# Altium footprint library TranDangKhoa-LIB.PcbLib: 1435 footprints (part 44 of 90)
Each footprint in its own frame and in the unit in brackets; x right, y up, seen from the top. Pads: shape width x height; smd on the part's side, far side on the other; paste and mask are expansions set on the pad; w line width, h text height; cw(c..) or ccw(c..) is an arc to the next point about the centre after c.
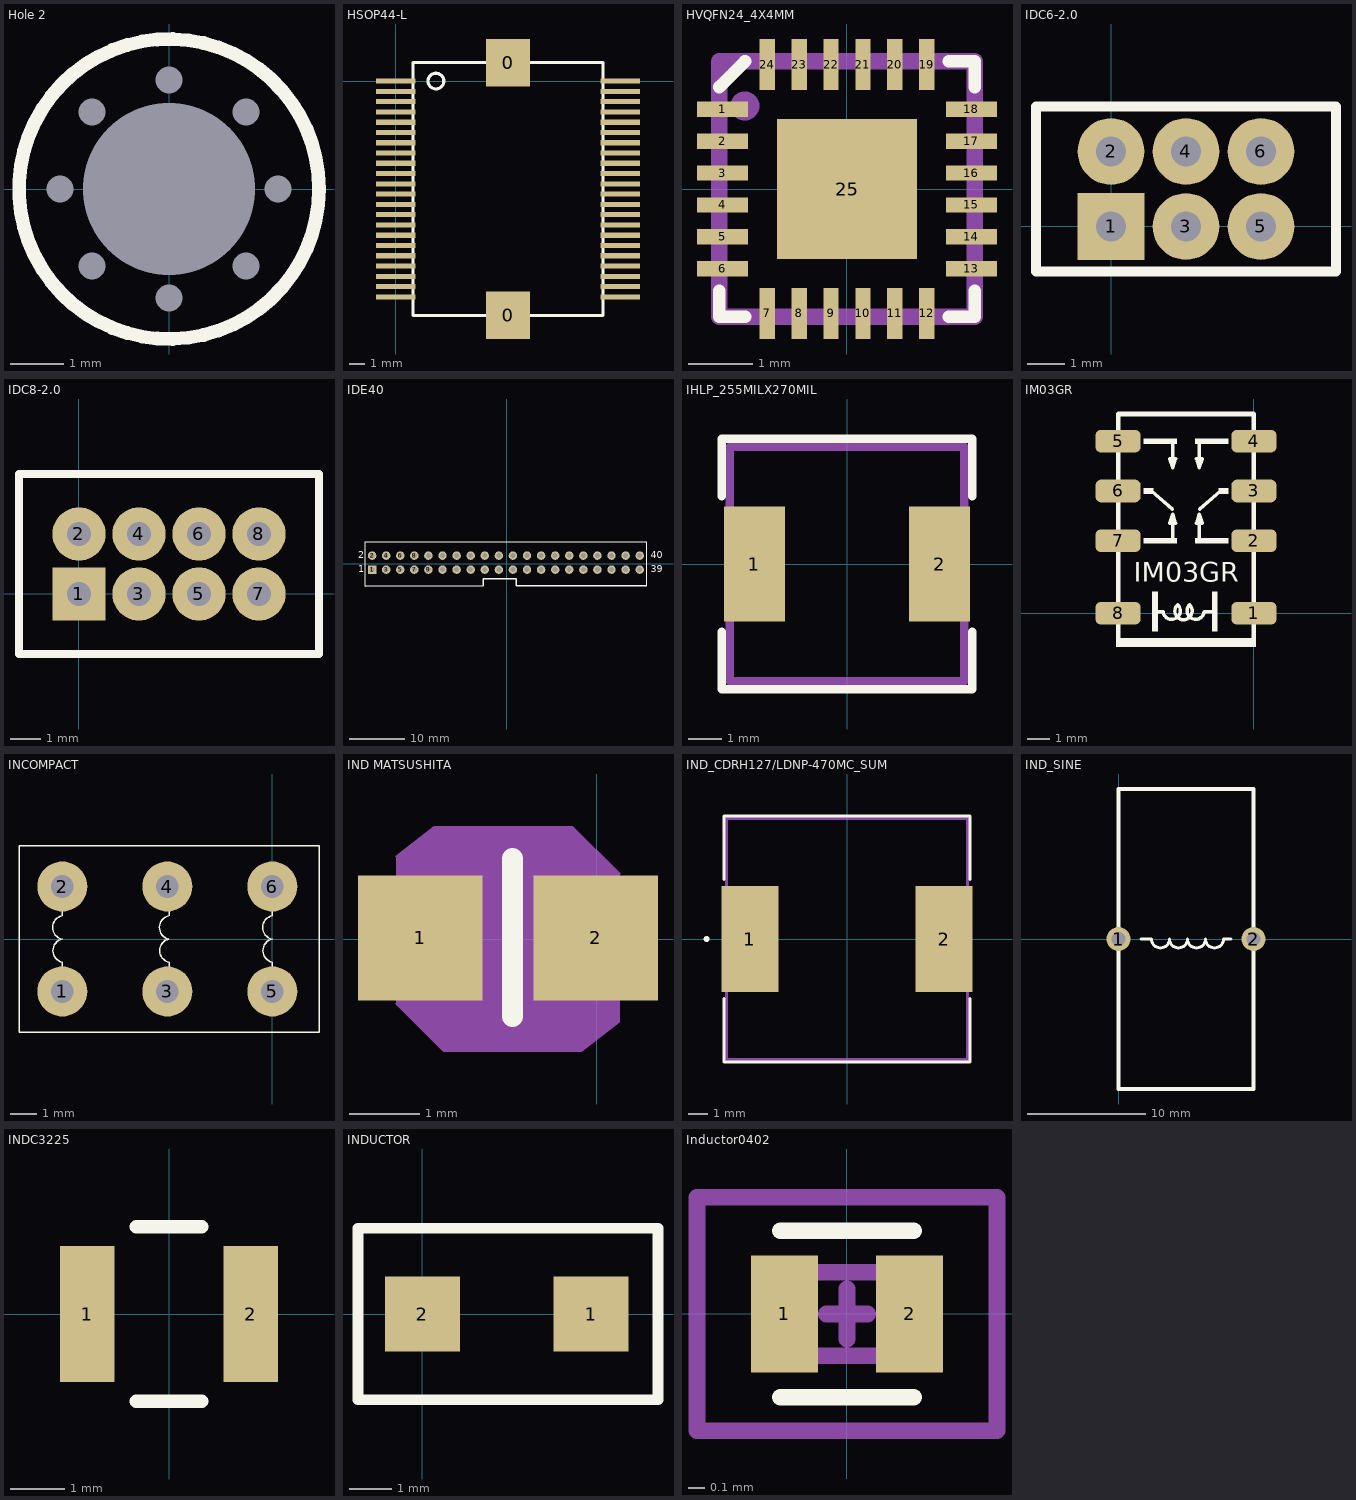
[diagram p43: the footprints below, top view; thin cyan lines are the x and y axes]

## Hole 2 [mm] "Hole 5mm-3.2mm"
pads (9):
  round 0 hole 0.5 unplated: 1(-2.032,0) 1(-1.437,-1.437) 1(-1.437,1.437) 1(0,-2.032) 1(0,2.032) 1(1.437,-1.437) 1(1.437,1.437) 1(2.032,0)
  round 0 hole 3.2 unplated: 1(0,0)
Top Overlay:
  circle w0.254: c0,0 r2.794

## HSOP44-L [mm]
pads (46):
  rect 2.8x3 smd: 0(7.1,-14.815) 0(7.1,1.162)
  rect 2.5x0.325 smd: 1(0,0) 2(0,-0.65) 3(0,-1.3) 4(0,-1.95) 5(0,-2.6) 6(0,-3.25) 7(0,-3.9) 8(0,-4.55) 9(0,-5.2) 10(0,-5.85) 11(0,-6.5) 12(0,-7.15) 13(0,-7.8) 14(0,-8.45) 15(0,-9.1) 16(0,-9.75) 17(0,-10.4) 18(0,-11.05) 19(0,-11.7) 20(0,-12.35) 21(0,-13) 22(0,-13.65) 23(14.2,-13.65) 24(14.2,-13) 25(14.2,-12.35) 26(14.2,-11.7) 27(14.2,-11.05) 28(14.2,-10.4) 29(14.2,-9.75) 30(14.2,-9.1) 31(14.2,-8.45) 32(14.2,-7.8) 33(14.2,-7.15) 34(14.2,-6.5) 35(14.2,-5.85) 36(14.2,-5.2) 37(14.2,-4.55) 38(14.2,-3.9) 39(14.2,-3.25) 40(14.2,-2.6) 41(14.2,-1.95) 42(14.2,-1.3) 43(14.2,-0.65) 44(14.2,0)
Top Overlay:
  circle w0.2: c2.54,0 r0.5
  lines w0.2: 1.1,-14.825 1.1,1.175 13.1,1.175 13.1,-14.825 1.1,-14.825

## HVQFN24_4X4MM [mm]
pads (25):
  rect 0.8x0.24 smd mask+0.025: 1(-1.95,1.25) 2(-1.95,0.75) 3(-1.95,0.25) 4(-1.95,-0.25) 5(-1.95,-0.75) 6(-1.95,-1.25) 13(1.95,-1.25) 14(1.95,-0.75) 15(1.95,-0.25) 16(1.95,0.25) 17(1.95,0.75) 18(1.95,1.25)
  rect 0.24x0.8 smd mask+0.025: 7(-1.25,-1.95) 8(-0.75,-1.95) 9(-0.25,-1.95) 10(0.25,-1.95) 11(0.75,-1.95) 12(1.25,-1.95) 19(1.25,1.95) 20(0.75,1.95) 21(0.25,1.95) 22(-0.25,1.95) 23(-0.75,1.95) 24(-1.25,1.95)
  rect 2.2x2.2 smd mask+0.025: 25(0,0)
Top Overlay:
  lines w0.2: -2,-1.6 -2,-2 -1.6,-2 ; -2,1.6 -1.6,2 ; 1.6,-2 2,-2 2,-1.6 ; 1.6,2 2,2 2,1.6
Mechanical 16:
  circle w0.254: c-1.6,1.3 r0.1
  lines w0.254: -2,-2 2,-2 2,2 -2,2 -2,-2
Mechanical 29:
  text ".Designator" at -0.2,0.7 h0.6
3D body: height 1, standoff 0, extent -2,-2 2,2

## IDC6-2.0 [mil]
pads (6):
  rect 70x70 hole 32 unplated: 1(0,0)
  round 70 hole 32 unplated: 2(0,78.74) 3(78.74,0) 4(78.74,78.74) 5(157.48,0) 6(157.48,78.74)
Top Overlay:
  lines w10: -78.74,-47.24 -78.74,125.98 236.22,125.98 236.22,-47.24 -78.74,-47.24

## IDC8-2.0 [mil]
pads (8):
  rect 70x70 hole 32 unplated: 1(0,0)
  round 70 hole 32 unplated: 2(0,78.74) 3(78.74,0) 4(78.74,78.74) 5(157.48,0) 6(157.48,78.74) 7(236.22,0) 8(236.22,78.74)
Top Overlay:
  lines w10: -78.74,-78.74 314.96,-78.74 314.96,157.48 -78.74,157.48 -78.74,0 -78.74,-78.74

## IDE40 [mil]
pads (40):
  rect 60x60 hole 35 unplated: 1(-955.2,-43.54)
  round 60 hole 35 unplated: 2(-955.2,56.46) 3(-855.2,-43.54) 4(-855.2,56.46) 5(-755.2,-43.54) 6(-755.2,56.46) 7(-655.2,-43.54) 8(-655.2,56.46) 9(-555.2,-43.54) 10(-555.2,56.46) 11(-455.2,-43.54) 12(-455.2,56.46) 13(-355.2,-43.54) 14(-355.2,56.46) 15(-255.2,-43.54) 16(-255.2,56.46) 17(-155.2,-43.54) 18(-155.2,56.46) 19(-55.2,-43.54) 20(-55.2,56.46) 21(44.8,-43.54) 22(44.8,56.46) 23(144.8,-43.54) 24(144.8,56.46) 25(244.8,-43.54) 26(244.8,56.46) 27(344.8,-43.54) 28(344.8,56.46) 29(444.8,-43.54) 30(444.8,56.46) 31(544.8,-43.54) 32(544.8,56.46) 33(644.8,-43.54) 34(644.8,56.46) 35(744.8,-43.54) 36(744.8,56.46) 37(844.8,-43.54) 38(844.8,56.46) 39(944.8,-43.54) 40(944.8,56.46)
Top Overlay:
  lines w7.87: -1005.2,-162.44 -1005.2,155.67 994.8,155.67 994.09,-157.48
  lines w10: -1005.2,-162.44 -167.32,-157.48 -167.32,-127.95 -167.32,-108.27 68.9,-108.27 68.9,-157.48 994.09,-157.48
  text "39" at 1024.8,-63.54 h50
  text "40" at 1024.8,36.46 h50
  text "2" at -1055.2,36.46 h50
  text "1" at -1055.2,-63.54 h50

## IHLP_255MILX270MIL [mil]
pads (2):
  rect 72x135 smd: 1(-109,0) 2(109,0)
Top Overlay:
  lines w10: -147.64,-80 -147.64,-147.64 147.64,-147.64 147.64,-80 ; -147.64,80 -147.64,147.64 147.64,147.64 147.64,80
Mechanical 16:
  lines w10: -137.8,-137.8 137.8,-137.8 137.8,137.8 -137.8,137.8 -137.8,-137.8
Mechanical 29:
  text ".Designator" at 39.37,27.56 h60
3D body: height 118.11, standoff 0, extent -95.72,-130 95.77,130.01
3D body: height 118.11, standoff 0, extent -119.25,-130 -72.19,-82.85
3D body: height 118.11, standoff 0, extent -119.25,82.94 -72.1,130
3D body: height 118.11, standoff 0, extent 72.19,82.95 119.34,130.01
3D body: height 118.11, standoff 0, extent 72.2,-130 119.25,-82.85
3D body: height 118.11, standoff 0, extent 95.63,-106.43 119.34,106.57
3D body: height 118.11, standoff 0, extent -119.25,-106.42 -95.53,106.57
3D body: height 78.74, standoff 0, extent -134.93,-62.92 -119.18,63.07
3D body: height 78.74, standoff 0, extent 119.34,-62.92 135.09,63.06

## IM03GR [mm]
pads (8):
  rrect50% 2x1 smd paste+0 mask+0: 1(0,0) 2(0,3.2) 3(0,5.4) 4(0,7.6) 5(-6,7.6) 6(-6,5.4) 7(-6,3.2) 8(-6,0)
Top Overlay:
  region: 0.1,-1.5 0.1,-1.2 -6.1,-1.2 -6.1,-1.5
  region: -3.387,3.074 -3.387,3.328 -4.876,3.328 -4.876,3.074
  region: -4.876,7.726 -4.876,7.472 -3.387,7.472 -3.387,7.726
  region: -4.879,5.526 -4.879,5.272 -4.43,5.272 -4.43,5.526
  region: -1.571,5.524 -1.571,5.27 -1.123,5.27 -1.123,5.524
  region: -2.613,7.726 -2.613,7.472 -1.124,7.472 -1.124,7.726
  region: -1.124,3.074 -1.124,3.328 -2.613,3.328 -2.613,3.074
  region: -1.604,0.953 -1.858,0.953 -1.858,-0.8 -1.604,-0.8
  rectangle: -4.5,-0.8 -4.246,0.953
  lines w0.152: -4.543,5.412 -3.6,4.6 ; -4.424,0.063 -4.017,0.063 ; -4.011,0.07 ccw(c-3.632,0.112) -3.363,0.381 ccw(c-3.11,0.096) -2.841,0.365 ; -3.587,3.302 -3.587,4.364 ; -3.587,7.498 -3.587,6.436 ; -2.843,0.381 ccw(c-2.574,0.112) -2.195,0.07 ; -2.413,3.302 -2.413,4.364 ; -2.413,7.498 -2.413,6.436 ; -2.4,4.6 -1.457,5.412 ; -2.189,0.063 -1.782,0.063 ; -3.587,4.364 -3.46,3.983 -3.714,3.983 -3.587,4.364 ; -3.587,6.436 -3.714,6.817 -3.46,6.817 -3.587,6.436 ; -2.413,4.364 -2.286,3.983 -2.54,3.983 -2.413,4.364 ; -2.413,6.436 -2.54,6.817 -2.286,6.817 -2.413,6.436
  lines w0.203: -6,-0.5 -6,-1.2 -3,-1.2 0,-1.2 0,-0.5 ; -6,0.5 -6,2.7 ; -6,3.7 -6,4.9 ; -6,5.9 -6,7.1 ; -6,8.1 -6,8.8 -3,8.8 0,8.8 0,8.1 ; 0,0.5 0,2.7 ; 0,3.7 0,4.9 ; 0,5.9 0,7.1
  text "IM03GR" at -5.3,1.4 h0.86
3D body: height 3.8, standoff 0, extent -5.969,-1.016 -0.127,8.636
3D body: height 0.14, standoff 0, extent -6.682,7.473 -5.855,7.79
3D body: height 0.14, standoff 0, extent -0.136,7.443 0.691,7.76
3D body: height 0.14, standoff 0, extent -0.159,5.23 0.668,5.547
3D body: height 0.14, standoff 0, extent -0.128,3.056 0.699,3.373
3D body: height 0.14, standoff 0, extent -0.136,-0.169 0.691,0.148
3D body: height 0.14, standoff 0, extent -6.705,5.268 -5.878,5.585
3D body: height 0.14, standoff 0, extent -6.729,3.047 -5.902,3.364
3D body: height 0.14, standoff 0, extent -6.791,-0.132 -5.964,0.185

## IMX6 REX MODULE 3D [mm] ".Creator MM"
3D body "iMX6 Rex_V1I1_PCB(Prototype) - 18-OCT-2013.step": height 9.6, standoff 1.61, extent 0,0 70,40

## INCOMPACT [mm]
pads (6):
  round 1.905 hole 0.864: 1(-8,-2) 2(-8,2) 3(-4,-2) 4(-4,2) 5(0,-2) 6(0,2)
Top Overlay:
  lines w0.051: -8.002,-0.007 cw(c-7.911,0.441) -8.001,0.889 -8.001,2.032 ; -8.001,-2.032 -8.001,-0.889 ; -8.001,0 ccw(c-7.913,-0.44) -7.999,-0.881 ; -3.938,-0.007 cw(c-3.847,0.441) -3.937,0.889 -3.937,2.032 ; -3.937,-2.032 -3.937,-0.889 ; -3.937,0 ccw(c-3.849,-0.44) -3.935,-0.881 ; -0.001,-0.007 cw(c0.09,0.441) 0,0.889 0,2.032 ; 0,-2.032 0,-0.889 ; 0,0 ccw(c0.088,-0.44) 0.002,-0.881 ; -9.652,-3.556 -9.652,3.556 1.778,3.556 1.778,-3.556 -9.652,-3.556

## IND MATSUSHITA [mil]
pads (2):
  rect 70x70 smd: 1(-98.98,0.79) 2(-0.55,0.79)
Top Overlay:
  lines w11.81: -47.24,-43.31 -47.24,45.28
Mechanical 2:
  region: -8.52,-63.37 13.23,-46.45 1.14,-30.91 -20.61,-47.83
  region: -101.04,31.12 -79.29,48.04 -91.38,63.58 -113.13,46.66
  region: -86.18,-63.15 13.72,36.75 -13.35,63.81 -113.25,-36.09
  rectangle: -91.1,-2.13 -13.35,63.61
  rectangle: -86.18,-63.18 -8.42,2.55
  rectangle: -112.75,-36.61 -86.18,46.66
  rectangle: -34.01,-46.45 13.23,36.23
Mechanical 6:
  lines w1.97: -86.77,10.63 13.23,10.63 ; 5.36,8 13.23,10.63 ; 5.36,13.25 13.23,10.63 ; 13.23,8.66 13.23,12.6

## IND_CDRH127/LDNP-470MC_SUM [mil]
pads (2):
  rect 114x213 smd: 1(-195,0) 2(195,0)
Top Overlay:
  lines w6: -247,-120 -247,-247 247,-247 247,-120 ; -247,120 -247,247 247,247 247,120 ; -285,0 cw(c-282,0) -279,0 cw(c-282,0) -285,0
Mechanical 13:
  lines w0: -242,0 cw(c-239,0) -236,0 cw(c-239,0) -242,0
  lines w6: -242,-242 -242,0 -242,242 242,242 242,-242 -242,-242
3D body "step_temp.STEP": height 314.96, standoff 0, extent -236.22,-236.22 236.22,236.22

## IND_SINE [mil]
pads (2):
  round 80 hole 47.24: 1(0,0) 2(450,0)
Top Overlay:
  lines w10: 75,0 110,0 ccw(c140,0) 170,0 ccw(c200,0) 230,0 ccw(c260,0) 290,0 ccw(c320,0) 350,0 375,0
  lines w12: 0,-500 0,0 0,500 450,500 450,-500 0,-500

## INDC3225 [mm]
pads (2):
  rect 1x2.5 smd: 1(-1.5,0) 2(1.5,0)
Top Overlay:
  lines w0.254: -0.6,-1.6 0.6,-1.6 ; -0.6,1.6 0.6,1.6
3D body: height 0.89, standoff 0.76, extent -0.825,-0.83 0.949,0.944
3D body: height 0.76, standoff 0.51, extent -0.719,-0.754 0.799,0.764
3D body: height 0.64, standoff 0, extent -0.85,-0.831 0.961,0.979
3D body: height 1.02, standoff 0.89, extent -0.763,-0.627 0.754,0.891
3D body: height 1.14, standoff 1.02, extent -0.71,-0.815 1.064,0.959
3D body: height 1.27, standoff 1.14, extent -0.945,-0.786 0.875,1.026
3D body: height 0.51, standoff 0, extent -1.252,-1.136 1.288,1.15
3D body: height 1.78, standoff 1.27, extent -1.252,-1.136 1.288,1.15
3D body: height 1.78, standoff 0, extent 0.831,0.87 1.275,1.124
3D body: height 1.78, standoff 0, extent 0.831,-1.111 1.275,-0.857
3D body: height 1.78, standoff 0, extent -1.227,0.87 -0.782,1.124
3D body: height 1.78, standoff 0, extent -1.227,-1.111 -0.782,-0.857
3D body: height 0.38, standoff 0, extent 1.288,-0.374 1.415,0.388
3D body: height 0.38, standoff 0, extent -1.379,-0.311 -1.252,0.451
3D body: height 0.64, standoff 0, extent 0.713,-0.401 1.415,0.134
3D body: height 0.64, standoff 0, extent -1.316,0.134 -0.674,0.667

## INDUCTOR [mil]
pads (2):
  rect 70x70 smd: 1(157.48,0) 2(0,0)
Top Overlay:
  lines w10: -60,-80 220,-80 220,80 -60,80 -60,-80

## Inductor0402 [mm]
pads (2):
  rect 0.4x0.7 smd mask+0.01: 1(-0.375,0) 2(0.375,0)
Top Overlay:
  lines w0.1: -0.4,-0.5 0.4,-0.5 ; -0.4,0.5 0.4,0.5
Mechanical 13:
  lines w0.1: -0.5,-0.25 -0.5,0.25 0.5,0.25 0.5,-0.25 -0.5,-0.25
Mechanical 15:
  lines w0.1: -0.125,0 0.125,0 ; 0,-0.15 0,0.15 ; -0.9,-0.7 -0.9,0.7 0.9,0.7 0.9,-0.7 -0.9,-0.7
3D body "Ind0402.STEP": height 0.5, standoff 0, extent -0.5,-0.25 0.5,0.25